# Altium footprint library ACTION标准库.pcblib: 504 footprints (part 3 of 32)
Each footprint in its own frame and in the unit in brackets; x right, y up, seen from the top. Pads: shape width x height; smd on the part's side, far side on the other; paste and mask are expansions set on the pad; w line width, h text height; cw(c..) or ccw(c..) is an arc to the next point about the centre after c.
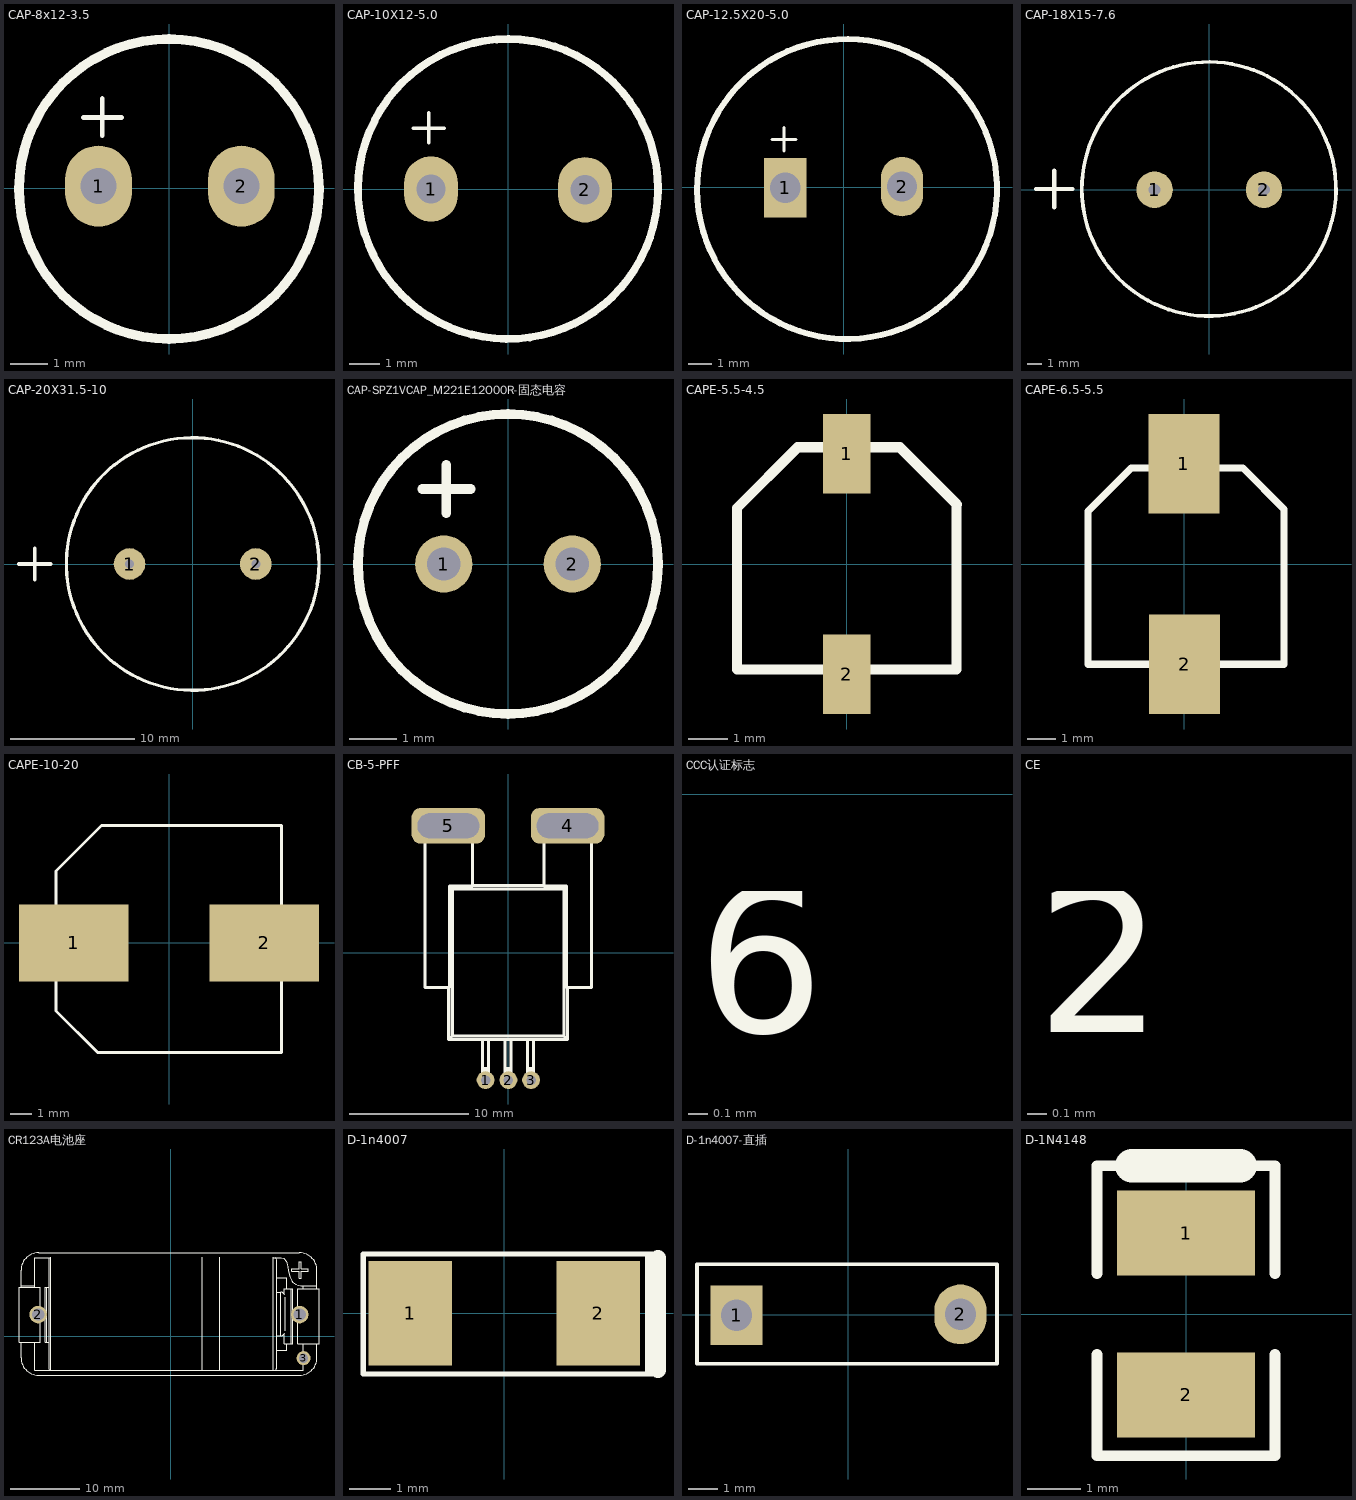
[diagram p2: the footprints below, top view; thin cyan lines are the x and y axes]

## CAP-8x12-3.5 [mil]
pads (2):
  oval 70x85 hole 38: 1(-74,2) 2(76,2)
Top Overlay:
  circle w10: c0,-1 r157.48
  lines w5: -90,74 -50,74 ; -70,55 -70,94
3D body "Cap-EL(8x12-3_5)T.STEP": height 109.92, standoff -504.33, extent -157.48,-157.47 157.56,157.48

## CAP-10X12-5.0 [mil]
pads (2):
  oval 70x85 hole 38: 1(-100,0) 2(100,-1)
Top Overlay:
  lines w5: -123,79 -83,79 ; -103,60 -103,99
  lines w10: 194.81,-2.97 cw(c0,0) 194.83,0
3D body "CAP PR5.0x10x12.5mm.STEP": height 497.81, standoff -151.91, extent -197.84,-197.84 197.86,197.86

## CAP-12.5X20-5.0 [mil]
pads (2):
  rect 70x98.43 hole 50: 1(-96.5,-1)
  oval 70x98.43 hole 50: 2(96.5,1)
Top Overlay:
  lines w5: -118.5,79 -78.5,79 ; -98.5,60 -98.5,99
  lines w10: 249.22,42.9 ccw(c5.5,-3) 249.84,39.45
3D body "User Library-Cap-EL(12_5x20-5)T.STEP": height 137.8, standoff -807.17, extent -240.55,-254.05 251.65,238.06

## CAP-18X15-7.6 [mil]
pads (2):
  round 100 hole 32: 1(-150,0) 2(150,0)
Top Overlay:
  lines w10: -348.71,-19.79 cw(c-1,2) -348.42,-24.03
  lines w12: -475,2 -375,2 ; -425,-48 -425,52
3D body "User Library-HE Series 18X15.STEP": height 600.55, standoff -88.43, extent -353.33,-352.33 355.33,356.32

## CAP-20X31.5-10 [mil]
pads (2):
  round 100 hole 28: 1(-200,0) 2(200,0)
Top Overlay:
  circle w10: c0,0 r400
  lines w12: -550,0 -450,0 ; -500,-50 -500,50

## CAP-SPZ1VCAP_M221E12O00R-固态电容 [mm]
pads (2):
  round 1.2 hole 0.7: 1(-1.35,0) 2(1.35,0)
Top Overlay:
  circle w0.2: c0,0 r3.15
  lines w0.2: -1.803,1.575 -0.787,1.575 ; -1.295,1.067 -1.295,2.083

## CAPE-5.5-4.5 [mm]
pads (2):
  rect 1.2x2 smd: 1(0,2.781) 2(0,-2.781)
Top Overlay:
  lines w0.254: 1.336,2.944 2.779,1.501 ; -2.769,-2.654 2.769,-2.654 2.769,1.504 1.328,2.944 -1.236,2.944 -2.769,1.409 -2.769,-2.654
3D body "CAPE-C.STEP": height 5.41, standoff 0, extent -2.652,-2.785 2.648,3.115

## CAPE-6.5-5.5 [mm]
pads (2):
  rect 2.5x3.5 smd: 1(-0.013,3.531) 2(0.013,-3.531)
Top Overlay:
  lines w0.254: -3.391,-3.531 3.518,-3.531 3.518,1.93 2.07,3.378 -1.867,3.378 -3.391,1.854 -3.391,-3.531
3D body "CAPE-D.STEP": height 5.41, standoff -0.01, extent -3.237,-3.551 3.363,3.449

## CAPE-10-20 [mm]
height 0.6
pads (2):
  rect 5x3.5 smd: 1(-4.343,0) 2(4.343,0)
Top Overlay:
  lines w0.127: -5.156,-3.099 -5.156,3.277 -3.073,5.359 5.131,5.359 5.131,-5.004 -3.251,-5.004 -5.156,-3.099
3D body "CAPE-G17.STEP": height 17, standoff 0, extent -6.15,-5.047 6.15,5.453

## CB-5-PFF [mm]
pads (5):
  round 1.5 hole 0.8: 1(-1.892,-10.706) 2(0.038,-10.706) 3(1.943,-10.706)
  rrect50% 6.2x3 hole 2.1 slot 5.2 at 0 deg: 4(5.016,10.706) 5(-5.016,10.706)
Top Overlay:
  lines w0.254: -4.989,-2.901 -4.989,-7.301 ; -2.989,5.699 3.011,5.699 ; -2.139,-10.552 -2.139,-9.982 ; -2.139,-10.431 -2.139,-9.743 ; -1.639,-10.552 -1.639,-9.982 ; -1.639,-10.431 -1.639,-9.743 ; -0.239,-10.552 -0.239,-9.982 ; -0.239,-10.431 -0.239,-9.743 ; 0.261,-10.552 0.261,-9.982 ; 0.261,-10.431 0.261,-9.743 ; 1.661,-10.552 1.661,-9.982 ; 1.661,-10.431 1.661,-9.743 ; 2.161,-10.552 2.161,-9.982 ; 2.161,-10.431 2.161,-9.743 ; 5.011,-2.901 5.011,-7.301 ; -6.989,9.475 -6.989,11.724 ; -6.989,9.475 -6.989,-2.901 -4.923,-2.901 -4.923,5.633 ; -6.989,9.475 -2.989,9.475 ; -6.989,11.724 -6.989,11.821 -2.989,11.821 -2.989,11.724 ; -6.989,11.724 -2.989,11.724 ; -4.989,-7.301 -4.682,-6.995 ; -4.989,-7.301 -2.139,-7.301 ; -4.923,5.633 -4.682,5.392 ; -4.923,5.633 -2.989,5.633 -2.989,9.475 ; -4.682,-6.995 -4.682,5.392 ; -4.682,-6.995 4.705,-6.995 ; -4.682,5.392 4.705,5.392 ; -2.989,9.475 -2.989,11.724 ; -2.139,-9.982 -1.639,-9.982 ; -2.139,-9.982 -1.639,-9.982 ; -2.139,-9.743 -2.139,-7.301 ; -2.139,-9.743 -1.639,-9.743 ; -2.139,-7.301 -1.639,-7.301 ; -1.639,-9.743 -1.639,-7.301 ; -1.639,-7.301 -0.239,-7.301 ; -0.239,-9.982 0.261,-9.982 ; -0.239,-9.982 0.261,-9.982 ; -0.239,-9.743 -0.239,-7.301 ; -0.239,-9.743 0.261,-9.743 ; -0.239,-7.301 0.261,-7.301 ; 0.261,-9.743 0.261,-7.301 ; 0.261,-7.301 1.661,-7.301 ; 1.661,-9.982 2.161,-9.982 ; 1.661,-9.982 2.161,-9.982 ; 1.661,-9.743 1.661,-7.301 ; 1.661,-9.743 2.161,-9.743 ; 1.661,-7.301 2.161,-7.301 ; 2.161,-9.743 2.161,-7.301 ; 2.161,-7.301 5.011,-7.301 ; 3.011,9.475 3.011,11.724 ; 3.011,9.475 3.011,5.633 4.946,5.633 ; 3.011,9.475 7.011,9.475 ; 3.011,11.724 3.011,11.821 7.011,11.821 7.011,11.724 ; 3.011,11.724 7.011,11.724 ; 4.705,-6.995 5.011,-7.301 ; 4.705,-6.995 4.705,5.392 ; 4.705,5.392 4.946,5.633 ; 4.946,5.633 4.946,-2.901 7.011,-2.901 7.011,9.475 ; 7.011,9.475 7.011,11.724
3D body "SW3dPS-ACS754SCB-200-PFF.STEP": height 7.31, standoff -3.2, extent -6.951,-11.24 7.049,11.582

## CCC认证标志 [mm]
Top Overlay:
  text "6" at -1.956,-1.499 h1.52

## CE [mm]
Top Overlay:
  text "2" at -2.896,-2.007 h1.52

## CR123A电池座 [mil]
pads (3):
  round 100 hole 70: 1(736,124.5) 2(-758,124.5)
  round 80 hole 53: 3(758,-124.5)
Top Overlay:
  lines w2.13: -855.83,-33.25 -855.83,-122.24 ccw(c-755.83,-122.24) -755.83,-222.24 734.17,-222.24 ccw(c734.17,-122.24) 834.17,-122.24 834.17,-42.06 ; -855.83,281.71 -855.83,289.53 ; -777.09,-33.25 -777.09,-194.68 755.43,-194.68 755.43,-42.06 ; -777.09,281.71 -777.09,289.53 ; -695.79,-189.56 ccw(c-685.79,-189.56) -694.38,-194.68 ; -695.79,-188.34 -695.79,445.44 cw(c-685.79,445.44) -694.59,450.2 ; -695.79,-33.25 -710.23,-33.25 ; -695.79,281.71 -710.23,281.71 ; -688.43,450.2 -777.09,450.2 -777.09,289.53 ; -685.79,-194.68 -685.79,450.56 ; 179.21,-194.68 179.21,450.56 ; 279.21,-194.68 279.21,450.56 ; 584.21,-194.68 584.21,450.56 ; 587.96,450.2 630.12,450.2 643.3,445.11 649.03,440.86 653.89,435.62 658.53,428.24 661.99,420.21 667.88,398.32 671.65,375.83 675.7,353.41 679.04,340.54 683.73,328.13 688.92,318.82 695.56,310.49 703.64,303.49 712.81,297.96 726.4,292.74 740.67,289.66 755.43,288.19 ; 597.3,-194.68 ccw(c584.21,-179.56) 604.21,-179.56 ; 597.7,450.2 cw(c584.21,435.44) 604.21,435.44 604.21,-178.38 ; 604.21,-78.97 660.78,-78.97 660.78,-42.06 ; 604.21,2.94 627.21,2.94 ; 604.21,252.94 627.21,252.94 ; 604.21,334.49 660.78,334.49 660.78,272.9 ; 648.81,-42.06 648.81,16.33 ; 648.81,239.76 648.81,272.9 ; 648.86,-42.06 688.57,-42.06 ; 649,272.9 688.57,272.9 ; 650.26,18.26 cw(c627.21,27.94) 627.21,2.94 ; 650.26,237.63 ccw(c627.21,227.94) 627.21,252.94 ; 652.21,31.88 652.21,223.97 ; 755.43,272.9 755.43,289.53 834.17,289.53 ; 834.17,272.9 834.17,289.53 ; -855.83,289.53 -777.09,289.53 ; -855.83,289.53 -855.83,377.76 cw(c-755.83,377.76) -755.83,477.76 734.17,477.76 cw(c734.17,377.76) 834.17,377.76 834.17,289.53 ; -710.23,-33.25 -710.23,281.71 ; -710.23,-33.25 -719.01,-33.25 -719.01,281.71 -710.23,281.71 ; 627.21,2.94 627.21,252.94 ; 688.57,-42.06 688.57,272.9 ; 688.57,-42.06 697.35,-42.06 697.35,272.9 688.57,272.9 ; -867.64,-33.25 -867.64,281.71 -746.11,281.71 -746.11,-33.25 -867.64,-33.25 ; 691.75,373.2 691.75,385.56 732.38,385.56 732.38,426.2 744.75,426.2 744.75,385.56 785.38,385.56 785.38,373.2 744.75,373.2 744.75,332.57 732.38,332.57 732.38,373.2 691.75,373.2 ; 724.45,-42.06 724.45,272.9 845.98,272.9 845.98,-42.06 724.45,-42.06
3D body: height 10, standoff 0, extent -21,125.5 -21,125.5
3D body "User Library-BH123A_assembly-1.STEP": height 694, standoff -158.38, extent -868.81,-224.5 844.81,475.5

## D-1n4007 [mil]
pads (2):
  rect 80x100 smd: 1(-90,0) 2(90,0)
Top Overlay:
  lines w5: 129,-58 145,-58 ; 146,57 137,57 ; 137,57 137,-58 -135,-58 -135,-10 -135,57 137,57
  lines w15: 147,-54 147,53
3D body "User Library-Diode SMD 1N4007-1.STEP": height 95.24, standoff -0.43, extent -113.32,-61.21 95.34,61.23

## D-1n4007-直插 [mil]
pads (2):
  rect 70x80 hole 42: 1(-150,-0.5)
  oval 70x80 hole 42: 2(150,0.5)
Top Overlay:
  lines w5: -203,-65.5 -203,67.5 199,67.5 199,-65.5 -203,-65.5
3D body "SW3dPS-1N4007.STEP": height 120.61, standoff -50, extent -169.49,-54.99 161.51,50.01

## D-1N4148 [mm]
height 5.08
pads (2):
  rect 2.6x1.6 smd: 1(0,1.524) 2(0,-1.524)
Top Overlay:
  lines w0.2: -1.676,-0.762 -1.676,-2.667 1.676,-2.667 1.676,-0.762 ; -1.676,0.762 -1.676,2.794 1.676,2.794 1.676,0.762
  lines w0.635: -1.016,2.794 1.016,2.794
3D body "1N4148 SMD.STEP": height 1.25, standoff 0, extent -0.94,-1.925 0.66,1.773